# Altium footprint library ref-packages-longpad.PCBLIB: 1527 footprints (part 97 of 103)
Each footprint in its own frame and in the unit in brackets; x right, y up, seen from the top. Pads: shape width x height; smd on the part's side, far side on the other; paste and mask are expansions set on the pad; w line width, h text height; cw(c..) or ccw(c..) is an arc to the next point about the centre after c.
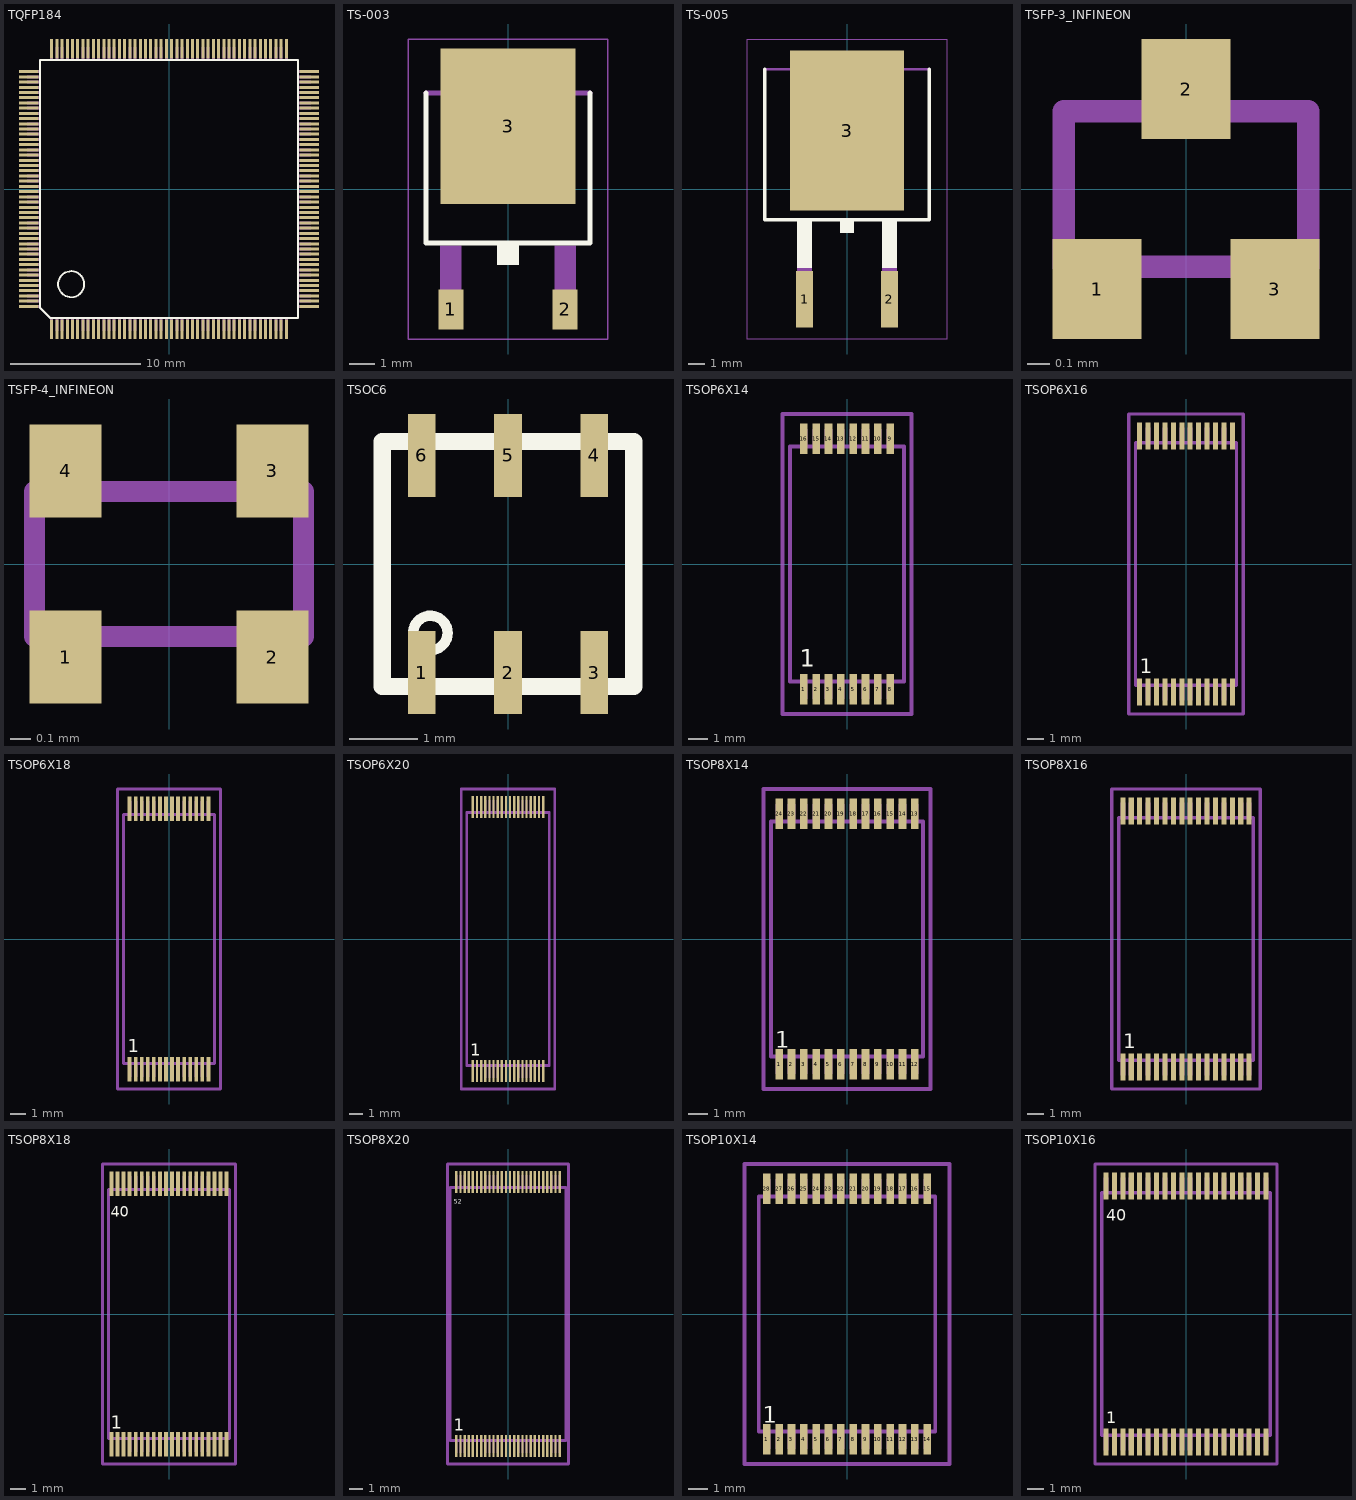
[diagram p96: the footprints below, top view; thin cyan lines are the x and y axes]

## TQFP184 [mm]
pads (184):
  rect 0.23x1.5 smd: 1(-9,-10.75) 2(-8.6,-10.75) 3(-8.2,-10.75) 4(-7.8,-10.75) 5(-7.4,-10.75) 6(-7,-10.75) 7(-6.6,-10.75) 8(-6.2,-10.75) 9(-5.8,-10.75) 10(-5.4,-10.75) 11(-5,-10.75) 12(-4.6,-10.75) 13(-4.2,-10.75) 14(-3.8,-10.75) 15(-3.4,-10.75) 16(-3,-10.75) 17(-2.6,-10.75) 18(-2.2,-10.75) 19(-1.8,-10.75) 20(-1.4,-10.75) 21(-1,-10.75) 22(-0.6,-10.75) 23(-0.2,-10.75) 24(0.2,-10.75) 25(0.6,-10.75) 26(1,-10.75) 27(1.4,-10.75) 28(1.8,-10.75) 29(2.2,-10.75) 30(2.6,-10.75) 31(3,-10.75) 32(3.4,-10.75) 33(3.8,-10.75) 34(4.2,-10.75) 35(4.6,-10.75) 36(5,-10.75) 37(5.4,-10.75) 38(5.8,-10.75) 39(6.2,-10.75) 40(6.6,-10.75) 41(7,-10.75) 42(7.4,-10.75) 43(7.8,-10.75) 44(8.2,-10.75) 45(8.6,-10.75) 46(9,-10.75) 93(9,10.75) 94(8.6,10.75) 95(8.2,10.75) 96(7.8,10.75) 97(7.4,10.75) 98(7,10.75) 99(6.6,10.75) 100(6.2,10.75) 101(5.8,10.75) 102(5.4,10.75) 103(5,10.75) 104(4.6,10.75) 105(4.2,10.75) 106(3.8,10.75) 107(3.4,10.75) 108(3,10.75) 109(2.6,10.75) 110(2.2,10.75) 111(1.8,10.75) 112(1.4,10.75) 113(1,10.75) 114(0.6,10.75) 115(0.2,10.75) 116(-0.2,10.75) 117(-0.6,10.75) 118(-1,10.75) 119(-1.8,10.75) 120(-1.4,10.75) 121(-2.2,10.75) 122(-2.6,10.75) 123(-3,10.75) 124(-3.4,10.75) 125(-3.8,10.75) 126(-4.2,10.75) 127(-4.6,10.75) 128(-5,10.75) 129(-5.4,10.75) 130(-5.8,10.75) 131(-6.2,10.75) 132(-6.6,10.75) 133(-7,10.75) 134(-7.4,10.75) 135(-7.8,10.75) 136(-8.2,10.75) 137(-8.6,10.75) 138(-9,10.75)
  rect 1.5x0.23 smd: 47(10.75,-9) 48(10.75,-8.6) 49(10.75,-8.2) 50(10.75,-7.8) 51(10.75,-7.4) 52(10.75,-7) 53(10.75,-6.6) 54(10.75,-6.2) 55(10.75,-5.8) 56(10.75,-5.4) 57(10.75,-5) 58(10.75,-4.6) 59(10.75,-4.2) 60(10.75,-3.8) 61(10.75,-3.4) 62(10.75,-3) 63(10.75,-2.6) 64(10.75,-2.2) 65(10.75,-1.8) 66(10.75,-1.4) 67(10.75,-1) 68(10.75,-0.6) 69(10.75,-0.2) 70(10.75,0.2) 71(10.75,0.6) 72(10.75,1) 73(10.75,1.8) 74(10.75,1.4) 75(10.75,2.2) 76(10.75,2.6) 77(10.75,3) 78(10.75,3.4) 79(10.75,3.8) 80(10.75,4.2) 81(10.75,4.6) 82(10.75,5) 83(10.75,5.4) 84(10.75,5.8) 85(10.75,6.2) 86(10.75,6.6) 87(10.75,7) 88(10.75,7.4) 89(10.75,7.8) 90(10.75,8.2) 91(10.75,8.6) 92(10.75,9) 139(-10.75,9) 140(-10.75,8.6) 141(-10.75,8.2) 142(-10.75,7.8) 143(-10.75,7.4) 144(-10.75,7) 145(-10.75,6.6) 146(-10.75,6.2) 147(-10.75,5.8) 148(-10.75,5.4) 149(-10.75,5) 150(-10.75,4.6) 151(-10.75,4.2) 152(-10.75,3.8) 153(-10.75,3.4) 154(-10.75,3) 155(-10.75,2.6) 156(-10.75,2.2) 157(-10.75,1.8) 158(-10.75,1.4) 159(-10.75,1) 160(-10.75,0.6) 161(-10.75,0.2) 162(-10.75,-0.2) 163(-10.75,-0.6) 164(-10.75,-1) 165(-10.75,-1.8) 166(-10.75,-1.4) 167(-10.75,-2.2) 168(-10.75,-2.6) 169(-10.75,-3) 170(-10.75,-3.4) 171(-10.75,-3.8) 172(-10.75,-4.2) 173(-10.75,-4.6) 174(-10.75,-5) 175(-10.75,-5.4) 176(-10.75,-5.8) 177(-10.75,-6.2) 178(-10.75,-6.6) 179(-10.75,-7) 180(-10.75,-7.4) 181(-10.75,-7.8) 182(-10.75,-8.2) 183(-10.75,-8.6) 184(-10.75,-9)
Top Overlay:
  circle w0.152: c-7.5,-7.3 r1
  lines w0.152: -9.873,-9.123 -9.123,-9.873 9.873,-9.873 9.873,9.873 -9.873,9.873 -9.873,-9.123
Mechanical 16:
  drawing of 184 lines, arcs and shapes, not listed

## TS-003 [mm]
pads (3):
  rect 1x1.6 smd: 1(-2.28,-4.8) 2(2.28,-4.8)
  rect 5.4x6.2 smd: 3(0,2.5)
Top Overlay:
  rectangle: -0.432,-3.023 0.432,-2.261
  lines w0.203: -3.277,3.835 -3.277,-2.159 3.277,-2.159 3.277,3.835
Mechanical 16:
  rectangle: -2.718,-5.156 -1.854,-2.261
  rectangle: 1.854,-5.156 2.718,-2.261
  region: 0,0 0.254,0 0.254,0.254 0,0.254
  lines w0.203: -3.277,3.835 3.277,3.835 ; -2.565,3.937 -2.565,4.648 -2.108,5.105 2.108,5.105 2.565,4.648 2.565,3.937 -2.565,3.937
Mechanical 27:
  lines w0.051: -3.973,-5.983 3.973,-5.983 3.973,5.983 -3.973,5.983 -3.973,-5.983

## TS-005 [mm]
pads (3):
  rect 1x3.4 smd: 1(-2.54,-6.6) 2(2.54,-6.6)
  rect 6.8x9.6 smd: 3(0,3.5)
Top Overlay:
  rectangle: -0.432,-2.643 0.432,-1.881
  rectangle: -2.99,-4.74 -2.09,-1.94
  rectangle: 2.09,-4.74 2.99,-1.94
  lines w0.203: -4.917,7.165 -4.917,-1.839 4.917,-1.839 4.917,7.165
Mechanical 16:
  rectangle: -3,-7.5 -2.1,-4.7
  rectangle: 2.1,-7.5 3,-4.7
  region: 0,0 0.254,0 0.254,0.254 0,0.254
  lines w0.152: -4.917,7.165 4.917,7.165 ; 2.6,7.2 2.6,7.3 ; 2.6,7.3 2.6,7.7 2.2,8.1 -2.2,8.1 -2.6,7.7 -2.6,7.3 2.6,7.3
Mechanical 27:
  lines w0.051: -5.973,-8.983 5.973,-8.983 5.973,8.983 -5.973,8.983 -5.973,-8.983

## TSFP-3_INFINEON [mil]
pads (3):
  rect 15.75x17.72 smd: 1(-15.75,-17.72) 2(0,17.72) 3(15.75,-17.72)
Mechanical 16:
  rectangle: -3.94,13.78 3.94,23.62
  rectangle: -19.69,-23.62 -11.81,-13.78
  rectangle: 11.81,-23.62 19.69,-13.78
  lines w4: -21.65,-13.78 21.65,-13.78 21.65,13.78 -21.65,13.78 -21.65,-13.78

## TSFP-4_INFINEON [mm]
pads (4):
  rect 0.35x0.45 smd: 1(-0.5,-0.45) 2(0.5,-0.45) 3(0.5,0.45) 4(-0.5,0.45)
Mechanical 16:
  rectangle: -0.6,-0.6 -0.4,-0.35
  rectangle: 0.4,-0.6 0.6,-0.35
  rectangle: 0.4,0.35 0.6,0.6
  rectangle: -0.6,0.35 -0.4,0.6
  lines w0.102: -0.65,-0.35 0.65,-0.35 0.65,0.35 -0.65,0.35 -0.65,-0.35

## TSOC6 [mil]
pads (6):
  rect 16x48 smd: 1(-50,-63) 2(0,-63) 3(50,-63) 4(50,63) 5(0,63) 6(-50,63)
Top Overlay:
  circle w6: c-45,-40 r10
  lines w10: -73,-71 73,-71 73,71 -73,71 -73,-71
Mechanical 16:
  rectangle: -54,-82 -46,-42
  rectangle: -4,-82 4,-42
  rectangle: 46,-82 54,-42
  rectangle: 46,42 54,82
  rectangle: -4,42 4,82
  rectangle: -54,42 -46,82

## TSOP6X14 [mil]
pads (16):
  rect 15.75x62.99 smd: 1(-89.57,-259.84) 2(-63.98,-259.84) 3(-38.39,-259.84) 4(-12.8,-259.84) 5(12.8,-259.84) 6(38.39,-259.84) 7(63.98,-259.84) 8(89.57,-259.84) 9(89.57,259.84) 10(63.98,259.84) 11(38.39,259.84) 12(12.8,259.84) 13(-12.8,259.84) 14(-38.39,259.84) 15(-63.98,259.84) 16(-89.57,259.84)
Top Overlay:
  text "1" at -97.69,-225.59 h62
Mechanical 16:
  rectangle: -97.44,-279.53 -81.69,-247.24
  rectangle: -71.85,-279.53 -56.1,-247.24
  rectangle: -46.26,-279.53 -30.51,-247.24
  rectangle: -20.67,-279.53 -4.92,-247.24
  rectangle: 4.92,-279.53 20.67,-247.24
  rectangle: 30.51,-279.53 46.26,-247.24
  rectangle: 56.1,-279.53 71.85,-247.24
  rectangle: 81.69,-279.53 97.44,-247.24
  rectangle: 81.69,247.24 97.44,279.53
  rectangle: 56.1,247.24 71.85,279.53
  rectangle: 30.51,247.24 46.26,279.53
  rectangle: 4.92,247.24 20.67,279.53
  rectangle: -20.67,247.24 -4.92,279.53
  rectangle: -46.26,247.24 -30.51,279.53
  rectangle: -71.85,247.24 -56.1,279.53
  rectangle: -97.44,247.24 -81.69,279.53
  lines w8: -117.91,-243.9 117.91,-243.9 117.91,243.9 -117.91,243.9 -117.91,-243.9
Mechanical 27:
  lines w7.87: -133.86,-311.02 -133.86,311.02 133.86,311.02 133.86,-311.02 -133.86,-311.02

## TSOP6X16 [mil]
pads (24):
  rect 11.81x62.99 smd: 1(-108.27,-299.21) 2(-88.58,-299.21) 3(-68.9,-299.21) 4(-49.21,-299.21) 5(-29.53,-299.21) 6(-9.84,-299.21) 7(9.84,-299.21) 8(29.53,-299.21) 9(49.21,-299.21) 10(68.9,-299.21) 11(88.58,-299.21) 12(108.27,-299.21) 13(108.27,299.21) 14(88.58,299.21) 15(68.9,299.21) 16(49.21,299.21) 17(29.53,299.21) 18(9.84,299.21) 19(-9.84,299.21) 20(-29.53,299.21) 21(-49.21,299.21) 22(-68.9,299.21) 23(-88.58,299.21) 24(-108.27,299.21)
Top Overlay:
  text "1" at -107.53,-255.12 h34
Mechanical 16:
  rectangle: -114.17,-318.9 -102.36,-285.43
  rectangle: -94.49,-318.9 -82.68,-285.43
  rectangle: -74.8,-318.9 -62.99,-285.43
  rectangle: -55.12,-318.9 -43.31,-285.43
  rectangle: -35.43,-318.9 -23.62,-285.43
  rectangle: -15.75,-318.9 -3.94,-285.43
  rectangle: 3.94,-318.9 15.75,-285.43
  rectangle: 23.62,-318.9 35.43,-285.43
  rectangle: 43.31,-318.9 55.12,-285.43
  rectangle: 62.99,-318.9 74.8,-285.43
  rectangle: 82.68,-318.9 94.49,-285.43
  rectangle: 102.36,-318.9 114.17,-285.43
  rectangle: 102.36,285.43 114.17,318.9
  rectangle: 82.68,285.43 94.49,318.9
  rectangle: 62.99,285.43 74.8,318.9
  rectangle: 43.31,285.43 55.12,318.9
  rectangle: 23.62,285.43 35.43,318.9
  rectangle: 3.94,285.43 15.75,318.9
  rectangle: -15.75,285.43 -3.94,318.9
  rectangle: -35.43,285.43 -23.62,318.9
  rectangle: -55.12,285.43 -43.31,318.9
  rectangle: -74.8,285.43 -62.99,318.9
  rectangle: -94.49,285.43 -82.68,318.9
  rectangle: -114.17,285.43 -102.36,318.9
  lines w8: -117.91,-283.27 117.91,-283.27 117.91,283.27 -117.91,283.27 -117.91,-283.27
Mechanical 27:
  lines w7.87: -133.86,-350.39 -133.86,350.39 133.86,350.39 133.86,-350.39 -133.86,-350.39

## TSOP6X18 [mm]
pads (28):
  rect 0.25x1.6 smd: 1(-2.6,-8.6) 2(-2.2,-8.6) 3(-1.8,-8.6) 4(-1.4,-8.6) 5(-1,-8.6) 6(-0.6,-8.6) 7(-0.2,-8.6) 8(0.2,-8.6) 9(0.6,-8.6) 10(1,-8.6) 11(1.4,-8.6) 12(1.8,-8.6) 13(2.2,-8.6) 14(2.6,-8.6) 15(2.6,8.6) 16(2.2,8.6) 17(1.8,8.6) 18(1.4,8.6) 19(1,8.6) 20(0.6,8.6) 21(0.2,8.6) 22(-0.2,8.6) 23(-0.6,8.6) 24(-1,8.6) 25(-1.4,8.6) 26(-1.8,8.6) 27(-2.2,8.6) 28(-2.6,8.6)
Top Overlay:
  text "1" at -2.731,-7.48 h0.86
Mechanical 16:
  rectangle: -2.71,-9.1 -2.49,-8.27
  rectangle: -2.31,-9.1 -2.09,-8.27
  rectangle: -1.91,-9.1 -1.69,-8.27
  rectangle: -1.51,-9.1 -1.29,-8.27
  rectangle: -1.11,-9.1 -0.89,-8.27
  rectangle: -0.71,-9.1 -0.49,-8.27
  rectangle: -0.31,-9.1 -0.09,-8.27
  rectangle: 0.09,-9.1 0.31,-8.27
  rectangle: 0.49,-9.1 0.71,-8.27
  rectangle: 0.89,-9.1 1.11,-8.27
  rectangle: 1.29,-9.1 1.51,-8.27
  rectangle: 1.69,-9.1 1.91,-8.27
  rectangle: 2.09,-9.1 2.31,-8.27
  rectangle: 2.49,-9.1 2.71,-8.27
  rectangle: 2.49,8.27 2.71,9.1
  rectangle: 2.09,8.27 2.31,9.1
  rectangle: 1.69,8.27 1.91,9.1
  rectangle: 1.29,8.27 1.51,9.1
  rectangle: 0.89,8.27 1.11,9.1
  rectangle: 0.49,8.27 0.71,9.1
  rectangle: 0.09,8.27 0.31,9.1
  rectangle: -0.31,8.27 -0.09,9.1
  rectangle: -0.71,8.27 -0.49,9.1
  rectangle: -1.11,8.27 -0.89,9.1
  rectangle: -1.51,8.27 -1.29,9.1
  rectangle: -1.91,8.27 -1.69,9.1
  rectangle: -2.31,8.27 -2.09,9.1
  rectangle: -2.71,8.27 -2.49,9.1
  lines w0.203: -2.995,-8.205 2.995,-8.205 2.995,8.205 -2.995,8.205 -2.995,-8.205
Mechanical 27:
  lines w0.2: -3.4,-9.9 -3.4,9.9 3.4,9.9 3.4,-9.9 -3.4,-9.9

## TSOP6X20 [mm]
pads (36):
  rect 0.17x1.6 smd: 1(-2.55,-9.6) 2(-2.25,-9.6) 3(-1.95,-9.6) 4(-1.65,-9.6) 5(-1.35,-9.6) 6(-1.05,-9.6) 7(-0.75,-9.6) 8(-0.45,-9.6) 9(-0.15,-9.6) 10(0.15,-9.6) 11(0.45,-9.6) 12(0.75,-9.6) 13(1.05,-9.6) 14(1.35,-9.6) 15(1.65,-9.6) 16(1.95,-9.6) 17(2.25,-9.6) 18(2.55,-9.6) 19(2.55,9.6) 20(2.25,9.6) 21(1.95,9.6) 22(1.65,9.6) 23(1.35,9.6) 24(1.05,9.6) 25(0.75,9.6) 26(0.45,9.6) 27(0.15,9.6) 28(-0.15,9.6) 29(-0.45,9.6) 30(-0.75,9.6) 31(-1.05,9.6) 32(-1.35,9.6) 33(-1.65,9.6) 34(-1.95,9.6) 35(-2.25,9.6) 36(-2.55,9.6)
Top Overlay:
  text "1" at -2.731,-8.48 h0.86
Mechanical 16:
  rectangle: -2.62,-10.1 -2.48,-9.25
  rectangle: -2.32,-10.1 -2.18,-9.25
  rectangle: -2.02,-10.1 -1.88,-9.25
  rectangle: -1.72,-10.1 -1.58,-9.25
  rectangle: -1.42,-10.1 -1.28,-9.25
  rectangle: -1.12,-10.1 -0.98,-9.25
  rectangle: -0.82,-10.1 -0.68,-9.25
  rectangle: -0.52,-10.1 -0.38,-9.25
  rectangle: -0.22,-10.1 -0.08,-9.25
  rectangle: 0.08,-10.1 0.22,-9.25
  rectangle: 0.38,-10.1 0.52,-9.25
  rectangle: 0.68,-10.1 0.82,-9.25
  rectangle: 0.98,-10.1 1.12,-9.25
  rectangle: 1.28,-10.1 1.42,-9.25
  rectangle: 1.58,-10.1 1.72,-9.25
  rectangle: 1.88,-10.1 2.02,-9.25
  rectangle: 2.18,-10.1 2.32,-9.25
  rectangle: 2.48,-10.1 2.62,-9.25
  rectangle: 2.48,9.25 2.62,10.1
  rectangle: 2.18,9.25 2.32,10.1
  rectangle: 1.88,9.25 2.02,10.1
  rectangle: 1.58,9.25 1.72,10.1
  rectangle: 1.28,9.25 1.42,10.1
  rectangle: 0.98,9.25 1.12,10.1
  rectangle: 0.68,9.25 0.82,10.1
  rectangle: 0.38,9.25 0.52,10.1
  rectangle: 0.08,9.25 0.22,10.1
  rectangle: -0.22,9.25 -0.08,10.1
  rectangle: -0.52,9.25 -0.38,10.1
  rectangle: -0.82,9.25 -0.68,10.1
  rectangle: -1.12,9.25 -0.98,10.1
  rectangle: -1.42,9.25 -1.28,10.1
  rectangle: -1.72,9.25 -1.58,10.1
  rectangle: -2.02,9.25 -1.88,10.1
  rectangle: -2.32,9.25 -2.18,10.1
  rectangle: -2.62,9.25 -2.48,10.1
  lines w0.203: -2.995,-9.195 2.995,-9.195 2.995,9.195 -2.995,9.195 -2.995,-9.195
Mechanical 27:
  lines w0.2: -3.4,-10.9 -3.4,10.9 3.4,10.9 3.4,-10.9 -3.4,-10.9

## TSOP8X14 [mil]
pads (24):
  rect 15.75x62.99 smd: 1(-140.75,-259.84) 2(-115.16,-259.84) 3(-89.57,-259.84) 4(-63.98,-259.84) 5(-38.39,-259.84) 6(-12.8,-259.84) 7(12.8,-259.84) 8(38.39,-259.84) 9(63.98,-259.84) 10(89.57,-259.84) 11(115.16,-259.84) 12(140.75,-259.84) 13(140.75,259.84) 14(115.16,259.84) 15(89.57,259.84) 16(63.98,259.84) 17(38.39,259.84) 18(12.8,259.84) 19(-12.8,259.84) 20(-38.39,259.84) 21(-63.98,259.84) 22(-89.57,259.84) 23(-115.16,259.84) 24(-140.75,259.84)
Top Overlay:
  text "1" at -148.87,-225.59 h34
Mechanical 16:
  rectangle: -148.62,-279.53 -132.87,-247.24
  rectangle: -123.03,-279.53 -107.28,-247.24
  rectangle: -97.44,-279.53 -81.69,-247.24
  rectangle: -71.85,-279.53 -56.1,-247.24
  rectangle: -46.26,-279.53 -30.51,-247.24
  rectangle: -20.67,-279.53 -4.92,-247.24
  rectangle: 4.92,-279.53 20.67,-247.24
  rectangle: 30.51,-279.53 46.26,-247.24
  rectangle: 56.1,-279.53 71.85,-247.24
  rectangle: 81.69,-279.53 97.44,-247.24
  rectangle: 107.28,-279.53 123.03,-247.24
  rectangle: 132.87,-279.53 148.62,-247.24
  rectangle: 132.87,247.24 148.62,279.53
  rectangle: 107.28,247.24 123.03,279.53
  rectangle: 81.69,247.24 97.44,279.53
  rectangle: 56.1,247.24 71.85,279.53
  rectangle: 30.51,247.24 46.26,279.53
  rectangle: 4.92,247.24 20.67,279.53
  rectangle: -20.67,247.24 -4.92,279.53
  rectangle: -46.26,247.24 -30.51,279.53
  rectangle: -71.85,247.24 -56.1,279.53
  rectangle: -97.44,247.24 -81.69,279.53
  rectangle: -123.03,247.24 -107.28,279.53
  rectangle: -148.62,247.24 -132.87,279.53
  lines w8: -157.28,-243.9 157.28,-243.9 157.28,243.9 -157.28,243.9 -157.28,-243.9
Mechanical 27:
  lines w7.87: -173.23,-311.02 -173.23,311.02 173.23,311.02 173.23,-311.02 -173.23,-311.02

## TSOP8X16 [mil]
pads (32):
  rect 11.81x62.99 smd: 1(-147.64,-299.21) 2(-127.95,-299.21) 3(-108.27,-299.21) 4(-88.58,-299.21) 5(-68.9,-299.21) 6(-49.21,-299.21) 7(-29.53,-299.21) 8(-9.84,-299.21) 9(9.84,-299.21) 10(29.53,-299.21) 11(49.21,-299.21) 12(68.9,-299.21) 13(88.58,-299.21) 14(108.27,-299.21) 15(127.95,-299.21) 16(147.64,-299.21) 17(147.64,299.21) 18(127.95,299.21) 19(108.27,299.21) 20(88.58,299.21) 21(68.9,299.21) 22(49.21,299.21) 23(29.53,299.21) 24(9.84,299.21) 25(-9.84,299.21) 26(-29.53,299.21) 27(-49.21,299.21) 28(-68.9,299.21) 29(-88.58,299.21) 30(-108.27,299.21) 31(-127.95,299.21) 32(-147.64,299.21)
Top Overlay:
  text "1" at -146.9,-255.12 h34
Mechanical 16:
  rectangle: -153.54,-318.9 -141.73,-285.43
  rectangle: -133.86,-318.9 -122.05,-285.43
  rectangle: -114.17,-318.9 -102.36,-285.43
  rectangle: -94.49,-318.9 -82.68,-285.43
  rectangle: -74.8,-318.9 -62.99,-285.43
  rectangle: -55.12,-318.9 -43.31,-285.43
  rectangle: -35.43,-318.9 -23.62,-285.43
  rectangle: -15.75,-318.9 -3.94,-285.43
  rectangle: 3.94,-318.9 15.75,-285.43
  rectangle: 23.62,-318.9 35.43,-285.43
  rectangle: 43.31,-318.9 55.12,-285.43
  rectangle: 62.99,-318.9 74.8,-285.43
  rectangle: 82.68,-318.9 94.49,-285.43
  rectangle: 102.36,-318.9 114.17,-285.43
  rectangle: 122.05,-318.9 133.86,-285.43
  rectangle: 141.73,-318.9 153.54,-285.43
  rectangle: 141.73,285.43 153.54,318.9
  rectangle: 122.05,285.43 133.86,318.9
  rectangle: 102.36,285.43 114.17,318.9
  rectangle: 82.68,285.43 94.49,318.9
  rectangle: 62.99,285.43 74.8,318.9
  rectangle: 43.31,285.43 55.12,318.9
  rectangle: 23.62,285.43 35.43,318.9
  rectangle: 3.94,285.43 15.75,318.9
  rectangle: -15.75,285.43 -3.94,318.9
  rectangle: -35.43,285.43 -23.62,318.9
  rectangle: -55.12,285.43 -43.31,318.9
  rectangle: -74.8,285.43 -62.99,318.9
  rectangle: -94.49,285.43 -82.68,318.9
  rectangle: -114.17,285.43 -102.36,318.9
  rectangle: -133.86,285.43 -122.05,318.9
  rectangle: -153.54,285.43 -141.73,318.9
  lines w8: -157.28,-283.27 157.28,-283.27 157.28,283.27 -157.28,283.27 -157.28,-283.27
Mechanical 27:
  lines w7.87: -173.23,-350.39 -173.23,350.39 173.23,350.39 173.23,-350.39 -173.23,-350.39

## TSOP8X18 [mm]
pads (40):
  rect 0.25x1.6 smd: 1(-3.8,-8.6) 2(-3.4,-8.6) 3(-3,-8.6) 4(-2.6,-8.6) 5(-2.2,-8.6) 6(-1.8,-8.6) 7(-1.4,-8.6) 8(-1,-8.6) 9(-0.6,-8.6) 10(-0.2,-8.6) 11(0.2,-8.6) 12(0.6,-8.6) 13(1,-8.6) 14(1.4,-8.6) 15(1.8,-8.6) 16(2.2,-8.6) 17(2.6,-8.6) 18(3,-8.6) 19(3.4,-8.6) 20(3.8,-8.6) 21(3.8,8.6) 22(3.4,8.6) 23(3,8.6) 24(2.6,8.6) 25(2.2,8.6) 26(1.8,8.6) 27(1.4,8.6) 28(1,8.6) 29(0.6,8.6) 30(0.2,8.6) 31(-0.2,8.6) 32(-0.6,8.6) 33(-1,8.6) 34(-1.4,8.6) 35(-1.8,8.6) 36(-2.2,8.6) 37(-2.6,8.6) 38(-3,8.6) 39(-3.4,8.6) 40(-3.8,8.6)
Top Overlay:
  text "1" at -3.851,-7.57 h0.86
  text "40" at -3.851,6.43 h0.69
Mechanical 16:
  rectangle: -3.91,-9.1 -3.69,-8.27
  rectangle: -3.51,-9.1 -3.29,-8.27
  rectangle: -3.11,-9.1 -2.89,-8.27
  rectangle: -2.71,-9.1 -2.49,-8.27
  rectangle: -2.31,-9.1 -2.09,-8.27
  rectangle: -1.91,-9.1 -1.69,-8.27
  rectangle: -1.51,-9.1 -1.29,-8.27
  rectangle: -1.11,-9.1 -0.89,-8.27
  rectangle: -0.71,-9.1 -0.49,-8.27
  rectangle: -0.31,-9.1 -0.09,-8.27
  rectangle: 0.09,-9.1 0.31,-8.27
  rectangle: 0.49,-9.1 0.71,-8.27
  rectangle: 0.89,-9.1 1.11,-8.27
  rectangle: 1.29,-9.1 1.51,-8.27
  rectangle: 1.69,-9.1 1.91,-8.27
  rectangle: 2.09,-9.1 2.31,-8.27
  rectangle: 2.49,-9.1 2.71,-8.27
  rectangle: 2.89,-9.1 3.11,-8.27
  rectangle: 3.29,-9.1 3.51,-8.27
  rectangle: 3.69,-9.1 3.91,-8.27
  rectangle: 3.69,8.27 3.91,9.1
  rectangle: 3.29,8.27 3.51,9.1
  rectangle: 2.89,8.27 3.11,9.1
  rectangle: 2.49,8.27 2.71,9.1
  rectangle: 2.09,8.27 2.31,9.1
  rectangle: 1.69,8.27 1.91,9.1
  rectangle: 1.29,8.27 1.51,9.1
  rectangle: 0.89,8.27 1.11,9.1
  rectangle: 0.49,8.27 0.71,9.1
  rectangle: 0.09,8.27 0.31,9.1
  rectangle: -0.31,8.27 -0.09,9.1
  rectangle: -0.71,8.27 -0.49,9.1
  rectangle: -1.11,8.27 -0.89,9.1
  rectangle: -1.51,8.27 -1.29,9.1
  rectangle: -1.91,8.27 -1.69,9.1
  rectangle: -2.31,8.27 -2.09,9.1
  rectangle: -2.71,8.27 -2.49,9.1
  rectangle: -3.11,8.27 -2.89,9.1
  rectangle: -3.51,8.27 -3.29,9.1
  rectangle: -3.91,8.27 -3.69,9.1
  lines w0.203: -3.995,-8.205 3.995,-8.205 3.995,8.205 -3.995,8.205 -3.995,-8.205
Mechanical 27:
  lines w0.2: -4.4,-9.9 -4.4,9.9 4.4,9.9 4.4,-9.9 -4.4,-9.9

## TSOP8X20 [mm]
pads (52):
  rect 0.17x1.6 smd: 1(-3.75,-9.6) 2(-3.45,-9.6) 3(-3.15,-9.6) 4(-2.85,-9.6) 5(-2.55,-9.6) 6(-2.25,-9.6) 7(-1.95,-9.6) 8(-1.65,-9.6) 9(-1.35,-9.6) 10(-1.05,-9.6) 11(-0.75,-9.6) 12(-0.45,-9.6) 13(-0.15,-9.6) 14(0.15,-9.6) 15(0.45,-9.6) 16(0.75,-9.6) 17(1.05,-9.6) 18(1.35,-9.6) 19(1.65,-9.6) 20(1.95,-9.6) 21(2.25,-9.6) 22(2.55,-9.6) 23(2.85,-9.6) 24(3.15,-9.6) 25(3.45,-9.6) 26(3.75,-9.6) 27(3.75,9.6) 28(3.45,9.6) 29(3.15,9.6) 30(2.85,9.6) 31(2.55,9.6) 32(2.25,9.6) 33(1.95,9.6) 34(1.65,9.6) 35(1.35,9.6) 36(1.05,9.6) 37(0.75,9.6) 38(0.45,9.6) 39(0.15,9.6) 40(-0.15,9.6) 41(-0.45,9.6) 42(-0.75,9.6) 43(-1.05,9.6) 44(-1.35,9.6) 45(-1.65,9.6) 46(-1.95,9.6) 47(-2.25,9.6) 48(-2.55,9.6) 49(-2.85,9.6) 50(-3.15,9.6) 51(-3.45,9.6) 52(-3.75,9.6)
Top Overlay:
  text "1" at -3.931,-8.48 h0.86
  text "52" at -3.931,8.02 h0.35
Mechanical 16:
  rectangle: -3.82,-10.1 -3.68,-9.25
  rectangle: -3.52,-10.1 -3.38,-9.25
  rectangle: -3.22,-10.1 -3.08,-9.25
  rectangle: -2.92,-10.1 -2.78,-9.25
  rectangle: -2.62,-10.1 -2.48,-9.25
  rectangle: -2.32,-10.1 -2.18,-9.25
  rectangle: -2.02,-10.1 -1.88,-9.25
  rectangle: -1.72,-10.1 -1.58,-9.25
  rectangle: -1.42,-10.1 -1.28,-9.25
  rectangle: -1.12,-10.1 -0.98,-9.25
  rectangle: -0.82,-10.1 -0.68,-9.25
  rectangle: -0.52,-10.1 -0.38,-9.25
  rectangle: -0.22,-10.1 -0.08,-9.25
  rectangle: 0.08,-10.1 0.22,-9.25
  rectangle: 0.38,-10.1 0.52,-9.25
  rectangle: 0.68,-10.1 0.82,-9.25
  rectangle: 0.98,-10.1 1.12,-9.25
  rectangle: 1.28,-10.1 1.42,-9.25
  rectangle: 1.58,-10.1 1.72,-9.25
  rectangle: 1.88,-10.1 2.02,-9.25
  rectangle: 2.18,-10.1 2.32,-9.25
  rectangle: 2.48,-10.1 2.62,-9.25
  rectangle: 2.78,-10.1 2.92,-9.25
  rectangle: 3.08,-10.1 3.22,-9.25
  rectangle: 3.38,-10.1 3.52,-9.25
  rectangle: 3.68,-10.1 3.82,-9.25
  rectangle: 3.68,9.25 3.82,10.1
  rectangle: 3.38,9.25 3.52,10.1
  rectangle: 3.08,9.25 3.22,10.1
  rectangle: 2.78,9.25 2.92,10.1
  rectangle: 2.48,9.25 2.62,10.1
  rectangle: 2.18,9.25 2.32,10.1
  rectangle: 1.88,9.25 2.02,10.1
  rectangle: 1.58,9.25 1.72,10.1
  rectangle: 1.28,9.25 1.42,10.1
  rectangle: 0.98,9.25 1.12,10.1
  rectangle: 0.68,9.25 0.82,10.1
  rectangle: 0.38,9.25 0.52,10.1
  rectangle: 0.08,9.25 0.22,10.1
  rectangle: -0.22,9.25 -0.08,10.1
  rectangle: -0.52,9.25 -0.38,10.1
  rectangle: -0.82,9.25 -0.68,10.1
  rectangle: -1.12,9.25 -0.98,10.1
  rectangle: -1.42,9.25 -1.28,10.1
  rectangle: -1.72,9.25 -1.58,10.1
  rectangle: -2.02,9.25 -1.88,10.1
  rectangle: -2.32,9.25 -2.18,10.1
  rectangle: -2.62,9.25 -2.48,10.1
  rectangle: -2.92,9.25 -2.78,10.1
  rectangle: -3.22,9.25 -3.08,10.1
  rectangle: -3.52,9.25 -3.38,10.1
  rectangle: -3.82,9.25 -3.68,10.1
  lines w0.203: -4.195,-9.195 4.195,-9.195 4.195,9.195 -4.195,9.195 -4.195,-9.195
Mechanical 27:
  lines w0.2: -4.4,-10.9 -4.4,10.9 4.4,10.9 4.4,-10.9 -4.4,-10.9

## TSOP10X14 [mil]
pads (28):
  rect 15.75x62.99 smd: 1(-166.34,-259.84) 2(-140.75,-259.84) 3(-115.16,-259.84) 4(-89.57,-259.84) 5(-63.98,-259.84) 6(-38.39,-259.84) 7(-12.8,-259.84) 8(12.8,-259.84) 9(38.39,-259.84) 10(63.98,-259.84) 11(89.57,-259.84) 12(115.16,-259.84) 13(140.75,-259.84) 14(166.34,-259.84) 15(166.34,259.84) 16(140.75,259.84) 17(115.16,259.84) 18(89.57,259.84) 19(63.98,259.84) 20(38.39,259.84) 21(12.8,259.84) 22(-12.8,259.84) 23(-38.39,259.84) 24(-63.98,259.84) 25(-89.57,259.84) 26(-115.16,259.84) 27(-140.75,259.84) 28(-166.34,259.84)
Top Overlay:
  text "1" at -174.46,-225.59 h34
Mechanical 16:
  rectangle: -174.21,-279.53 -158.46,-247.24
  rectangle: -148.62,-279.53 -132.87,-247.24
  rectangle: -123.03,-279.53 -107.28,-247.24
  rectangle: -97.44,-279.53 -81.69,-247.24
  rectangle: -71.85,-279.53 -56.1,-247.24
  rectangle: -46.26,-279.53 -30.51,-247.24
  rectangle: -20.67,-279.53 -4.92,-247.24
  rectangle: 4.92,-279.53 20.67,-247.24
  rectangle: 30.51,-279.53 46.26,-247.24
  rectangle: 56.1,-279.53 71.85,-247.24
  rectangle: 81.69,-279.53 97.44,-247.24
  rectangle: 107.28,-279.53 123.03,-247.24
  rectangle: 132.87,-279.53 148.62,-247.24
  rectangle: 158.46,-279.53 174.21,-247.24
  rectangle: 158.46,247.24 174.21,279.53
  rectangle: 132.87,247.24 148.62,279.53
  rectangle: 107.28,247.24 123.03,279.53
  rectangle: 81.69,247.24 97.44,279.53
  rectangle: 56.1,247.24 71.85,279.53
  rectangle: 30.51,247.24 46.26,279.53
  rectangle: 4.92,247.24 20.67,279.53
  rectangle: -20.67,247.24 -4.92,279.53
  rectangle: -46.26,247.24 -30.51,279.53
  rectangle: -71.85,247.24 -56.1,279.53
  rectangle: -97.44,247.24 -81.69,279.53
  rectangle: -123.03,247.24 -107.28,279.53
  rectangle: -148.62,247.24 -132.87,279.53
  rectangle: -174.21,247.24 -158.46,279.53
  lines w8: -182.87,-243.9 182.87,-243.9 182.87,243.9 -182.87,243.9 -182.87,-243.9
Mechanical 27:
  lines w7.87: -212.6,-311.02 -212.6,311.02 212.6,311.02 212.6,-311.02 -212.6,-311.02

## TSOP10X16 [mil]
pads (40):
  rect 11.81x62.99 smd: 1(-187.01,-299.21) 2(-167.32,-299.21) 3(-147.64,-299.21) 4(-127.95,-299.21) 5(-108.27,-299.21) 6(-88.58,-299.21) 7(-68.9,-299.21) 8(-49.21,-299.21) 9(-29.53,-299.21) 10(-9.84,-299.21) 11(9.84,-299.21) 12(29.53,-299.21) 13(49.21,-299.21) 14(68.9,-299.21) 15(88.58,-299.21) 16(108.27,-299.21) 17(127.95,-299.21) 18(147.64,-299.21) 19(167.32,-299.21) 20(187.01,-299.21) 21(187.01,299.21) 22(167.32,299.21) 23(147.64,299.21) 24(127.95,299.21) 25(108.27,299.21) 26(88.58,299.21) 27(68.9,299.21) 28(49.21,299.21) 29(29.53,299.21) 30(9.84,299.21) 31(-9.84,299.21) 32(-29.53,299.21) 33(-49.21,299.21) 34(-68.9,299.21) 35(-88.58,299.21) 36(-108.27,299.21) 37(-127.95,299.21) 38(-147.64,299.21) 39(-167.32,299.21) 40(-187.01,299.21)
Top Overlay:
  text "1" at -186.27,-255.12 h27.2
  text "40" at -186.27,217.32 h27.2
Mechanical 16:
  rectangle: -192.91,-318.9 -181.1,-285.43
  rectangle: -173.23,-318.9 -161.42,-285.43
  rectangle: -153.54,-318.9 -141.73,-285.43
  rectangle: -133.86,-318.9 -122.05,-285.43
  rectangle: -114.17,-318.9 -102.36,-285.43
  rectangle: -94.49,-318.9 -82.68,-285.43
  rectangle: -74.8,-318.9 -62.99,-285.43
  rectangle: -55.12,-318.9 -43.31,-285.43
  rectangle: -35.43,-318.9 -23.62,-285.43
  rectangle: -15.75,-318.9 -3.94,-285.43
  rectangle: 3.94,-318.9 15.75,-285.43
  rectangle: 23.62,-318.9 35.43,-285.43
  rectangle: 43.31,-318.9 55.12,-285.43
  rectangle: 62.99,-318.9 74.8,-285.43
  rectangle: 82.68,-318.9 94.49,-285.43
  rectangle: 102.36,-318.9 114.17,-285.43
  rectangle: 122.05,-318.9 133.86,-285.43
  rectangle: 141.73,-318.9 153.54,-285.43
  rectangle: 161.42,-318.9 173.23,-285.43
  rectangle: 181.1,-318.9 192.91,-285.43
  rectangle: 181.1,285.43 192.91,318.9
  rectangle: 161.42,285.43 173.23,318.9
  rectangle: 141.73,285.43 153.54,318.9
  rectangle: 122.05,285.43 133.86,318.9
  rectangle: 102.36,285.43 114.17,318.9
  rectangle: 82.68,285.43 94.49,318.9
  rectangle: 62.99,285.43 74.8,318.9
  rectangle: 43.31,285.43 55.12,318.9
  rectangle: 23.62,285.43 35.43,318.9
  rectangle: 3.94,285.43 15.75,318.9
  rectangle: -15.75,285.43 -3.94,318.9
  rectangle: -35.43,285.43 -23.62,318.9
  rectangle: -55.12,285.43 -43.31,318.9
  rectangle: -74.8,285.43 -62.99,318.9
  rectangle: -94.49,285.43 -82.68,318.9
  rectangle: -114.17,285.43 -102.36,318.9
  rectangle: -133.86,285.43 -122.05,318.9
  rectangle: -153.54,285.43 -141.73,318.9
  rectangle: -173.23,285.43 -161.42,318.9
  rectangle: -192.91,285.43 -181.1,318.9
  lines w8: -196.65,-283.27 196.65,-283.27 196.65,283.27 -196.65,283.27 -196.65,-283.27
Mechanical 27:
  lines w7.87: -212.6,-350.39 -212.6,350.39 212.6,350.39 212.6,-350.39 -212.6,-350.39